# Altium footprint library 排针排座.PcbLib: 344 footprints (part 17 of 22)
Each footprint in its own frame and in the unit in brackets; x right, y up, seen from the top. Pads: shape width x height; smd on the part's side, far side on the other; paste and mask are expansions set on the pad; w line width, h text height; cw(c..) or ccw(c..) is an arc to the next point about the centre after c.
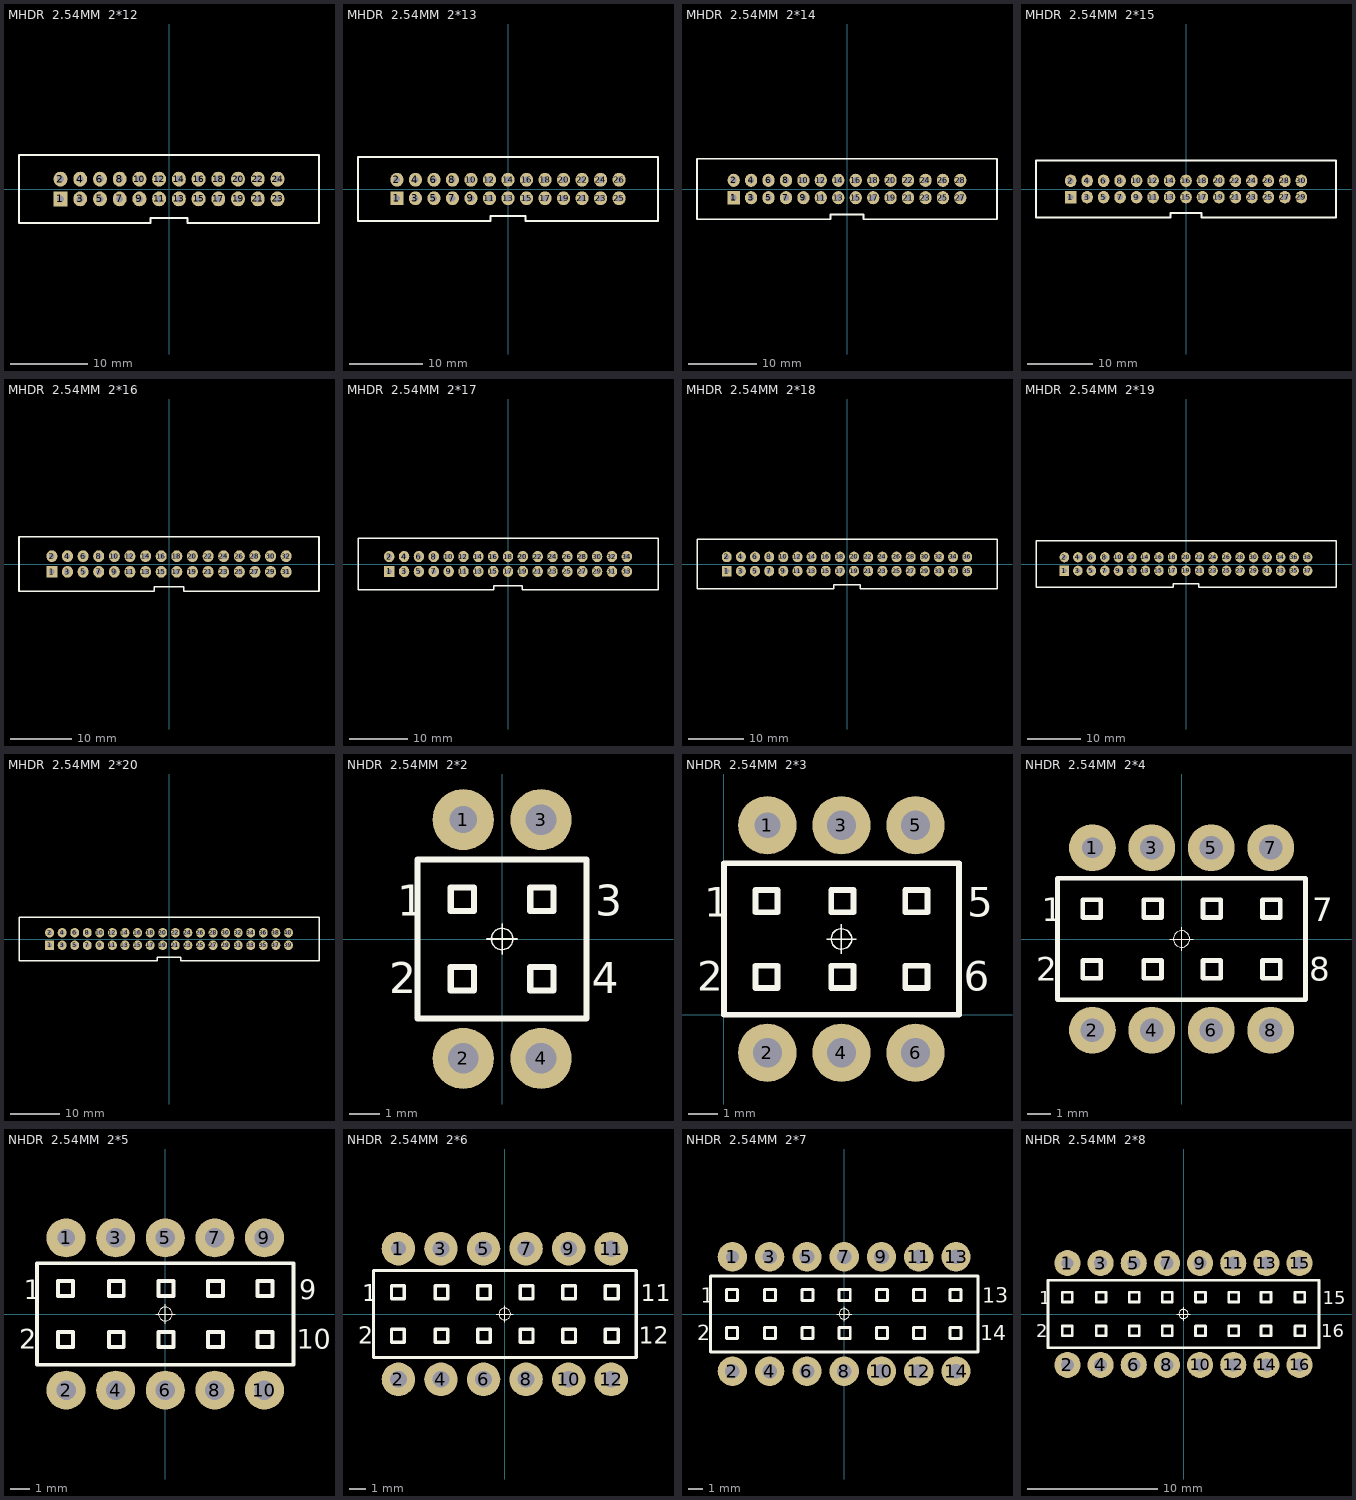
[diagram p16: the footprints below, top view; thin cyan lines are the x and y axes]

## MHDR  2.54MM  2*12 [mm] "24P"
height 8.8
pads (24):
  rect 1.778x1.905 hole 0.9: 1(-13.97,-1.27)
  oval 1.778x1.905 hole 0.9: 2(-13.97,1.27) 3(-11.43,-1.27) 4(-11.43,1.27) 5(-8.89,-1.27) 6(-8.89,1.27) 7(-6.35,-1.27) 8(-6.35,1.27) 9(-3.81,-1.27) 10(-3.81,1.27) 11(-1.27,-1.27) 12(-1.27,1.27) 13(1.27,-1.27) 14(1.27,1.27) 15(3.81,-1.27) 16(3.81,1.27) 17(6.35,-1.27) 18(6.35,1.27) 19(8.89,-1.27) 20(8.89,1.27) 21(11.43,-1.27) 22(11.43,1.27) 23(13.97,-1.27) 24(13.97,1.27)
Top Overlay:
  lines w0.254: -19.31,-4.4 -19.31,4.4 19.31,4.4 19.31,-4.4 2.4,-4.4 2.4,-3.708 -2.4,-3.708 -2.4,-4.4 -19.31,-4.4
3D body "MHDR2.54_24P.step": height 8.8, standoff -3.2, extent -19.31,-4.4 19.31,4.4

## MHDR  2.54MM  2*13 [mm] "26P"
height 8.8
pads (26):
  rect 1.778x1.905 hole 0.9: 1(-15.24,-1.27)
  oval 1.778x1.905 hole 0.9: 2(-15.24,1.27) 3(-12.7,-1.27) 4(-12.7,1.27) 5(-10.16,-1.27) 6(-10.16,1.27) 7(-7.62,-1.27) 8(-7.62,1.27) 9(-5.08,-1.27) 10(-5.08,1.27) 11(-2.54,-1.27) 12(-2.54,1.27) 13(0,-1.27) 14(0,1.27) 15(2.54,-1.27) 16(2.54,1.27) 17(5.08,-1.27) 18(5.08,1.27) 19(7.62,-1.27) 20(7.62,1.27) 21(10.16,-1.27) 22(10.16,1.27) 23(12.7,-1.27) 24(12.7,1.27) 25(15.24,-1.27) 26(15.24,1.27)
Top Overlay:
  lines w0.254: -20.58,-4.4 -20.58,4.4 20.58,4.4 20.58,-4.4 2.4,-4.4 2.4,-3.708 -2.4,-3.708 -2.4,-4.4 -20.58,-4.4
3D body "MHDR2.54_26P.step": height 8.8, standoff -3.2, extent -20.58,-4.4 20.58,4.4

## MHDR  2.54MM  2*14 [mm] "28P"
height 8.8
pads (28):
  rect 1.778x1.905 hole 0.9: 1(-16.51,-1.27)
  oval 1.778x1.905 hole 0.9: 2(-16.51,1.27) 3(-13.97,-1.27) 4(-13.97,1.27) 5(-11.43,-1.27) 6(-11.43,1.27) 7(-8.89,-1.27) 8(-8.89,1.27) 9(-6.35,-1.27) 10(-6.35,1.27) 11(-3.81,-1.27) 12(-3.81,1.27) 13(-1.27,-1.27) 14(-1.27,1.27) 15(1.27,-1.27) 16(1.27,1.27) 17(3.81,-1.27) 18(3.81,1.27) 19(6.35,-1.27) 20(6.35,1.27) 21(8.89,-1.27) 22(8.89,1.27) 23(11.43,-1.27) 24(11.43,1.27) 25(13.97,-1.27) 26(13.97,1.27) 27(16.51,-1.27) 28(16.51,1.27)
Top Overlay:
  lines w0.254: -21.85,-4.4 -2.4,-4.4 -2.4,-3.708 2.4,-3.708 2.4,-4.4 21.85,-4.4 21.85,4.4 -21.85,4.4 -21.85,-4.4
3D body "MHDR2.54_28P.step": height 8.8, standoff -3.2, extent -21.85,-4.4 21.85,4.4

## MHDR  2.54MM  2*15 [mm] "30P"
height 8.8
pads (30):
  rect 1.778x1.905 hole 0.9: 1(-17.78,-1.27)
  oval 1.778x1.905 hole 0.9: 2(-17.78,1.27) 3(-15.24,-1.27) 4(-15.24,1.27) 5(-12.7,-1.27) 6(-12.7,1.27) 7(-10.16,-1.27) 8(-10.16,1.27) 9(-7.62,-1.27) 10(-7.62,1.27) 11(-5.08,-1.27) 12(-5.08,1.27) 13(-2.54,-1.27) 14(-2.54,1.27) 15(0,-1.27) 16(0,1.27) 17(2.54,-1.27) 18(2.54,1.27) 19(5.08,-1.27) 20(5.08,1.27) 21(7.62,-1.27) 22(7.62,1.27) 23(10.16,-1.27) 24(10.16,1.27) 25(12.7,-1.27) 26(12.7,1.27) 27(15.24,-1.27) 28(15.24,1.27) 29(17.78,-1.27) 30(17.78,1.27)
Top Overlay:
  lines w0.254: -23.12,-4.4 -23.12,4.4 23.12,4.4 23.12,-4.4 2.4,-4.4 2.4,-3.708 -2.4,-3.708 -2.4,-4.4 -23.12,-4.4
3D body "MHDR2.54_30P.step": height 8.8, standoff -3.2, extent -23.12,-4.4 23.12,4.4

## MHDR  2.54MM  2*16 [mm] "32P"
height 8.8
pads (32):
  rect 1.778x1.905 hole 0.9: 1(-19.05,-1.27)
  oval 1.778x1.905 hole 0.9: 2(-19.05,1.27) 3(-16.51,-1.27) 4(-16.51,1.27) 5(-13.97,-1.27) 6(-13.97,1.27) 7(-11.43,-1.27) 8(-11.43,1.27) 9(-8.89,-1.27) 10(-8.89,1.27) 11(-6.35,-1.27) 12(-6.35,1.27) 13(-3.81,-1.27) 14(-3.81,1.27) 15(-1.27,-1.27) 16(-1.27,1.27) 17(1.27,-1.27) 18(1.27,1.27) 19(3.81,-1.27) 20(3.81,1.27) 21(6.35,-1.27) 22(6.35,1.27) 23(8.89,-1.27) 24(8.89,1.27) 25(11.43,-1.27) 26(11.43,1.27) 27(13.97,-1.27) 28(13.97,1.27) 29(16.51,-1.27) 30(16.51,1.27) 31(19.05,-1.27) 32(19.05,1.27)
Top Overlay:
  lines w0.254: -24.39,-4.4 -24.39,4.4 24.39,4.4 24.39,-4.4 2.4,-4.4 2.4,-3.708 -2.4,-3.708 -2.4,-4.4 -24.39,-4.4
3D body "MHDR2.54_32P.step": height 8.8, standoff -3.2, extent -24.39,-4.4 24.39,4.4

## MHDR  2.54MM  2*17 [mm] "34P"
height 8.8
pads (34):
  rect 1.778x1.905 hole 0.9: 1(-20.32,-1.27)
  oval 1.778x1.905 hole 0.9: 2(-20.32,1.27) 3(-17.78,-1.27) 4(-17.78,1.27) 5(-15.24,-1.27) 6(-15.24,1.27) 7(-12.7,-1.27) 8(-12.7,1.27) 9(-10.16,-1.27) 10(-10.16,1.27) 11(-7.62,-1.27) 12(-7.62,1.27) 13(-5.08,-1.27) 14(-5.08,1.27) 15(-2.54,-1.27) 16(-2.54,1.27) 17(0,-1.27) 18(0,1.27) 19(2.54,-1.27) 20(2.54,1.27) 21(5.08,-1.27) 22(5.08,1.27) 23(7.62,-1.27) 24(7.62,1.27) 25(10.16,-1.27) 26(10.16,1.27) 27(12.7,-1.27) 28(12.7,1.27) 29(15.24,-1.27) 30(15.24,1.27) 31(17.78,-1.27) 32(17.78,1.27) 33(20.32,-1.27) 34(20.32,1.27)
Top Overlay:
  lines w0.254: -25.66,-4.4 -25.66,4.4 25.66,4.4 25.66,-4.4 2.4,-4.4 2.4,-3.708 -2.4,-3.708 -2.4,-4.4 -25.66,-4.4
3D body "MHDR2.54_34P.step": height 8.8, standoff -3.2, extent -25.66,-4.4 25.66,4.4

## MHDR  2.54MM  2*18 [mm] "36P"
height 8.8
pads (36):
  rect 1.778x1.905 hole 0.9: 1(-21.59,-1.27)
  oval 1.778x1.905 hole 0.9: 2(-21.59,1.27) 3(-19.05,-1.27) 4(-19.05,1.27) 5(-16.51,-1.27) 6(-16.51,1.27) 7(-13.97,-1.27) 8(-13.97,1.27) 9(-11.43,-1.27) 10(-11.43,1.27) 11(-8.89,-1.27) 12(-8.89,1.27) 13(-6.35,-1.27) 14(-6.35,1.27) 15(-3.81,-1.27) 16(-3.81,1.27) 17(-1.27,-1.27) 18(-1.27,1.27) 19(1.27,-1.27) 20(1.27,1.27) 21(3.81,-1.27) 22(3.81,1.27) 23(6.35,-1.27) 24(6.35,1.27) 25(8.89,-1.27) 26(8.89,1.27) 27(11.43,-1.27) 28(11.43,1.27) 29(13.97,-1.27) 30(13.97,1.27) 31(16.51,-1.27) 32(16.51,1.27) 33(19.05,-1.27) 34(19.05,1.27) 35(21.59,-1.27) 36(21.59,1.27)
Top Overlay:
  lines w0.254: -26.93,-4.4 -2.4,-4.4 -2.4,-3.708 2.4,-3.708 2.4,-4.4 26.93,-4.4 26.93,4.4 -26.93,4.4 -26.93,-4.4
3D body "MHDR2.54_36P.step": height 8.8, standoff -3.2, extent -26.93,-4.4 26.93,4.4

## MHDR  2.54MM  2*19 [mm] "38P"
height 8.8
pads (38):
  rect 1.778x1.905 hole 0.9: 1(-22.86,-1.27)
  oval 1.778x1.905 hole 0.9: 2(-22.86,1.27) 3(-20.32,-1.27) 4(-20.32,1.27) 5(-17.78,-1.27) 6(-17.78,1.27) 7(-15.24,-1.27) 8(-15.24,1.27) 9(-12.7,-1.27) 10(-12.7,1.27) 11(-10.16,-1.27) 12(-10.16,1.27) 13(-7.62,-1.27) 14(-7.62,1.27) 15(-5.08,-1.27) 16(-5.08,1.27) 17(-2.54,-1.27) 18(-2.54,1.27) 19(0,-1.27) 20(0,1.27) 21(2.54,-1.27) 22(2.54,1.27) 23(5.08,-1.27) 24(5.08,1.27) 25(7.62,-1.27) 26(7.62,1.27) 27(10.16,-1.27) 28(10.16,1.27) 29(12.7,-1.27) 30(12.7,1.27) 31(15.24,-1.27) 32(15.24,1.27) 33(17.78,-1.27) 34(17.78,1.27) 35(20.32,-1.27) 36(20.32,1.27) 37(22.86,-1.27) 38(22.86,1.27)
Top Overlay:
  lines w0.254: -28.2,-4.4 -2.4,-4.4 -2.4,-3.708 2.4,-3.708 2.4,-4.4 28.2,-4.4 28.2,4.4 -28.2,4.4 -28.2,-4.4
3D body "MHDR2.54_38P.step": height 8.8, standoff -3.2, extent -28.2,-4.4 28.2,4.4

## MHDR  2.54MM  2*20 [mm] "40P"
height 8.8
pads (40):
  rect 1.778x1.905 hole 0.9: 1(-24.13,-1.27)
  oval 1.778x1.905 hole 0.9: 2(-24.13,1.27) 3(-21.59,-1.27) 4(-21.59,1.27) 5(-19.05,-1.27) 6(-19.05,1.27) 7(-16.51,-1.27) 8(-16.51,1.27) 9(-13.97,-1.27) 10(-13.97,1.27) 11(-11.43,-1.27) 12(-11.43,1.27) 13(-8.89,-1.27) 14(-8.89,1.27) 15(-6.35,-1.27) 16(-6.35,1.27) 17(-3.81,-1.27) 18(-3.81,1.27) 19(-1.27,-1.27) 20(-1.27,1.27) 21(1.27,-1.27) 22(1.27,1.27) 23(3.81,-1.27) 24(3.81,1.27) 25(6.35,-1.27) 26(6.35,1.27) 27(8.89,-1.27) 28(8.89,1.27) 29(11.43,-1.27) 30(11.43,1.27) 31(13.97,-1.27) 32(13.97,1.27) 33(16.51,-1.27) 34(16.51,1.27) 35(19.05,-1.27) 36(19.05,1.27) 37(21.59,-1.27) 38(21.59,1.27) 39(24.13,-1.27) 40(24.13,1.27)
Top Overlay:
  lines w0.254: -30.3,-4.4 -2.4,-4.4 -2.4,-3.708 2.4,-3.708 2.4,-4.4 30.3,-4.4 30.3,4.4 -30.3,4.4 -30.3,-4.4
3D body "MHDR2.54_40P.step": height 8.8, standoff -3.2, extent -29.47,-4.4 29.47,4.4

## NHDR  2.54MM  2*2 [mm] "脚距：2.54mm，直插双排母"
height 5
pads (4):
  round 2 hole 0.889: 1(-1.27,3.9)
  round 2 hole 1: 2(-1.27,-3.9) 3(1.27,3.9) 4(1.27,-3.9)
Top Overlay:
  circle w0.05: c0,0 r0.35
  lines w0.05: -0.5,0 0.5,0 ; 0,-0.5 0,0.5
  lines w0.2: -2.76,-2.6 -2.76,2.6 2.76,2.6 2.76,-2.6 -2.76,-2.6 ; -1.681,-1.681 -1.681,-0.919 -0.919,-0.919 -0.919,-1.681 -1.681,-1.681 ; -1.681,0.919 -1.681,1.681 -0.919,1.681 -0.919,0.919 -1.681,0.919 ; 0.919,-1.681 0.919,-0.919 1.681,-0.919 1.681,-1.681 0.919,-1.681 ; 0.919,0.919 0.919,1.681 1.681,1.681 1.681,0.919 0.919,0.919
  text "1" at -3.429,0.762 h1.02
  text "2" at -3.683,-1.778 h1.02
  text "4" at 2.921,-1.778 h1.02
  text "3" at 3.048,0.762 h1.02
3D body "NHDR  2.54MM  2-2.step": height 5.3, standoff -3.1, extent -2.76,-3.9 2.76,3.9

## NHDR  2.54MM  2*3 [mm] "脚距：2.54mm，直插双排母"
height 5
pads (6):
  round 2 hole 0.889: 1(1.49,6.5)
  round 2 hole 1: 2(1.49,-1.3) 3(4.03,6.5) 4(4.03,-1.3) 5(6.57,6.5) 6(6.57,-1.3)
Top Overlay:
  circle w0.05: c4.03,2.6 r0.35
  lines w0.05: 3.53,2.6 4.53,2.6 ; 4.03,2.1 4.03,3.1
  lines w0.2: 0,0 8.06,0 8.06,5.2 0,5.2 0,0 ; 1.079,0.919 1.079,1.681 1.841,1.681 1.841,0.919 1.079,0.919 ; 1.079,3.519 1.079,4.281 1.841,4.281 1.841,3.519 1.079,3.519 ; 3.679,0.919 3.679,1.681 4.441,1.681 4.441,0.919 3.679,0.919 ; 3.679,3.519 3.679,4.281 4.441,4.281 4.441,3.519 3.679,3.519 ; 6.219,0.919 6.981,0.919 6.981,1.681 6.219,1.681 6.219,0.919 ; 6.219,3.519 6.981,3.519 6.981,4.281 6.219,4.281 6.219,3.519
  text "5" at 8.348,3.362 h1.02
  text "6" at 8.221,0.822 h1.02
  text "1" at -0.669,3.362 h1.02
  text "2" at -0.923,0.822 h1.02
3D body "NHDR  2.54MM  2-3.step": height 5.3, standoff -3.1, extent 0,-1.3 8.06,6.5

## NHDR  2.54MM  2*4 [mm] "脚距：2.54mm，直插双排母"
height 5
pads (8):
  round 2 hole 0.889: 1(-3.81,3.9)
  round 2 hole 1: 2(-3.81,-3.9) 3(-1.27,3.9) 4(-1.27,-3.9) 5(1.27,3.9) 6(1.27,-3.9) 7(3.81,3.9) 8(3.81,-3.9)
Top Overlay:
  circle w0.05: c0,0 r0.35
  lines w0.05: -0.5,0 0.5,0 ; 0,-0.5 0,0.5
  lines w0.2: -5.3,-2.6 -5.3,2.6 5.3,2.6 5.3,-2.6 -5.3,-2.6 ; -4.221,-1.681 -4.221,-0.919 -3.459,-0.919 -3.459,-1.681 -4.221,-1.681 ; -4.221,0.919 -4.221,1.681 -3.459,1.681 -3.459,0.919 -4.221,0.919 ; -1.621,-1.681 -1.621,-0.919 -0.859,-0.919 -0.859,-1.681 -1.621,-1.681 ; -1.621,0.919 -1.621,1.681 -0.859,1.681 -0.859,0.919 -1.621,0.919 ; 0.919,-1.681 1.681,-1.681 1.681,-0.919 0.919,-0.919 0.919,-1.681 ; 0.919,0.919 1.681,0.919 1.681,1.681 0.919,1.681 0.919,0.919 ; 3.459,-1.681 3.459,-0.919 4.221,-0.919 4.221,-1.681 3.459,-1.681 ; 3.459,0.919 3.459,1.681 4.221,1.681 4.221,0.919 3.459,0.919
  text "8" at 5.461,-1.778 h1.02
  text "7" at 5.588,0.762 h1.02
  text "1" at -5.969,0.762 h1.02
  text "2" at -6.223,-1.778 h1.02
3D body "NHDR  2.54MM  2-4.step": height 5.3, standoff -3.1, extent -5.308,-3.891 5.291,3.909

## NHDR  2.54MM  2*5 [mm] "脚距：2.54mm，直插双排母"
height 5
pads (10):
  round 2 hole 0.889: 1(-5.08,3.9)
  round 2 hole 1: 2(-5.08,-3.9) 3(-2.54,3.9) 4(-2.54,-3.9) 5(0,3.9) 6(0,-3.9) 7(2.54,3.9) 8(2.54,-3.9) 9(5.08,3.9) 10(5.08,-3.9)
Top Overlay:
  circle w0.05: c0,0 r0.35
  lines w0.05: -0.5,0 0.5,0 ; 0,-0.5 0,0.5
  lines w0.2: -6.57,-2.6 6.57,-2.6 6.57,2.6 -6.57,2.6 -6.57,-2.6 ; -5.491,-1.681 -4.729,-1.681 -4.729,-0.919 -5.491,-0.919 -5.491,-1.681 ; -5.491,0.919 -4.729,0.919 -4.729,1.681 -5.491,1.681 -5.491,0.919 ; -2.891,-1.681 -2.129,-1.681 -2.129,-0.919 -2.891,-0.919 -2.891,-1.681 ; -2.891,0.919 -2.129,0.919 -2.129,1.681 -2.891,1.681 -2.891,0.919 ; -0.351,-1.681 -0.351,-0.919 0.411,-0.919 0.411,-1.681 -0.351,-1.681 ; -0.351,0.919 -0.351,1.681 0.411,1.681 0.411,0.919 -0.351,0.919 ; 2.189,-1.681 2.951,-1.681 2.951,-0.919 2.189,-0.919 2.189,-1.681 ; 2.189,0.919 2.951,0.919 2.951,1.681 2.189,1.681 2.189,0.919 ; 4.729,-1.681 5.491,-1.681 5.491,-0.919 4.729,-0.919 4.729,-1.681 ; 4.729,0.919 5.491,0.919 5.491,1.681 4.729,1.681 4.729,0.919
  text "2" at -7.493,-1.778 h1.02
  text "1" at -7.239,0.762 h1.02
  text "10" at 6.731,-1.778 h1.02
  text "9" at 6.858,0.762 h1.02
3D body "NHDR  2.54MM  2-5.step": height 5.3, standoff -3.1, extent -6.57,-3.9 6.57,3.9

## NHDR  2.54MM  2*6 [mm] "脚距：2.54mm，直插双排母"
height 5
pads (12):
  round 2 hole 0.889: 1(-6.35,3.9)
  round 2 hole 1: 2(-6.35,-3.9) 3(-3.81,3.9) 4(-3.81,-3.9) 5(-1.27,3.9) 6(-1.27,-3.9) 7(1.27,3.9) 8(1.27,-3.9) 9(3.81,3.9) 10(3.81,-3.9) 11(6.35,3.9) 12(6.35,-3.9)
Top Overlay:
  circle w0.05: c0,0 r0.35
  lines w0.05: -0.5,0 0.5,0 ; 0,-0.5 0,0.5
  lines w0.2: -7.84,-2.6 7.84,-2.6 7.84,2.6 -7.84,2.6 -7.84,-2.6 ; -6.761,-1.681 -5.999,-1.681 -5.999,-0.919 -6.761,-0.919 -6.761,-1.681 ; -6.761,0.919 -5.999,0.919 -5.999,1.681 -6.761,1.681 -6.761,0.919 ; -4.161,-1.681 -3.399,-1.681 -3.399,-0.919 -4.161,-0.919 -4.161,-1.681 ; -4.161,0.919 -3.399,0.919 -3.399,1.681 -4.161,1.681 -4.161,0.919 ; -1.621,-1.681 -1.621,-0.919 -0.859,-0.919 -0.859,-1.681 -1.621,-1.681 ; -1.621,0.919 -1.621,1.681 -0.859,1.681 -0.859,0.919 -1.621,0.919 ; 0.919,-1.681 1.681,-1.681 1.681,-0.919 0.919,-0.919 0.919,-1.681 ; 0.919,0.919 1.681,0.919 1.681,1.681 0.919,1.681 0.919,0.919 ; 3.459,-1.681 4.221,-1.681 4.221,-0.919 3.459,-0.919 3.459,-1.681 ; 3.459,0.919 4.221,0.919 4.221,1.681 3.459,1.681 3.459,0.919 ; 5.999,-1.681 6.761,-1.681 6.761,-0.919 5.999,-0.919 5.999,-1.681 ; 5.999,0.919 6.761,0.919 6.761,1.681 5.999,1.681 5.999,0.919
  text "11" at 8.128,0.762 h1.02
  text "12" at 8.001,-1.778 h1.02
  text "2" at -8.763,-1.778 h1.02
  text "1" at -8.509,0.762 h1.02
3D body "NHDR  2.54MM  2-6.step": height 5.3, standoff -3.1, extent -7.84,-3.9 7.84,3.9

## NHDR  2.54MM  2*7 [mm] "脚距：2.54mm，直插双排母"
height 5
pads (14):
  round 2 hole 0.889: 1(-7.62,3.9)
  round 2 hole 1: 2(-7.62,-3.9) 3(-5.08,3.9) 4(-5.08,-3.9) 5(-2.54,3.9) 6(-2.54,-3.9) 7(0,3.9) 8(0,-3.9) 9(2.54,3.9) 10(2.54,-3.9) 11(5.08,3.9) 12(5.08,-3.9) 13(7.62,3.9) 14(7.62,-3.9)
Top Overlay:
  circle w0.05: c0,0 r0.35
  lines w0.05: -0.5,0 0.5,0 ; 0,-0.5 0,0.5
  lines w0.2: -9.11,-2.6 9.11,-2.6 9.11,2.6 -9.11,2.6 -9.11,-2.6 ; -8.031,-1.681 -7.269,-1.681 -7.269,-0.919 -8.031,-0.919 -8.031,-1.681 ; -8.031,0.919 -7.269,0.919 -7.269,1.681 -8.031,1.681 -8.031,0.919 ; -5.431,-1.681 -4.669,-1.681 -4.669,-0.919 -5.431,-0.919 -5.431,-1.681 ; -5.431,0.919 -4.669,0.919 -4.669,1.681 -5.431,1.681 -5.431,0.919 ; -2.891,-1.681 -2.891,-0.919 -2.129,-0.919 -2.129,-1.681 -2.891,-1.681 ; -2.891,0.919 -2.891,1.681 -2.129,1.681 -2.129,0.919 -2.891,0.919 ; -0.351,-1.681 0.411,-1.681 0.411,-0.919 -0.351,-0.919 -0.351,-1.681 ; -0.351,0.919 0.411,0.919 0.411,1.681 -0.351,1.681 -0.351,0.919 ; 2.189,-1.681 2.951,-1.681 2.951,-0.919 2.189,-0.919 2.189,-1.681 ; 2.189,0.919 2.951,0.919 2.951,1.681 2.189,1.681 2.189,0.919 ; 4.729,-1.681 5.491,-1.681 5.491,-0.919 4.729,-0.919 4.729,-1.681 ; 4.729,0.919 5.491,0.919 5.491,1.681 4.729,1.681 4.729,0.919 ; 7.209,-1.681 7.209,-0.919 7.971,-0.919 7.971,-1.681 7.209,-1.681 ; 7.209,0.919 7.209,1.681 7.971,1.681 7.971,0.919 7.209,0.919
  text "14" at 9.271,-1.778 h1.02
  text "13" at 9.398,0.762 h1.02
  text "2" at -10.033,-1.778 h1.02
  text "1" at -9.779,0.762 h1.02
3D body "NHDR  2.54MM  2-7.step": height 5.3, standoff -3.1, extent -9.11,-3.9 9.11,3.9

## NHDR  2.54MM  2*8 [mm] "脚距：2.54mm，直插双排母"
height 5
pads (16):
  round 2 hole 0.889: 1(-8.89,3.9)
  round 2 hole 1: 2(-8.89,-3.9) 3(-6.35,3.9) 4(-6.35,-3.9) 5(-3.81,3.9) 6(-3.81,-3.9) 7(-1.27,3.9) 8(-1.27,-3.9) 9(1.27,3.9) 10(1.27,-3.9) 11(3.81,3.9) 12(3.81,-3.9) 13(6.35,3.9) 14(6.35,-3.9) 15(8.89,3.9) 16(8.89,-3.9)
Top Overlay:
  circle w0.05: c0,0 r0.35
  lines w0.05: -0.5,0 0.5,0 ; 0,-0.5 0,0.5
  lines w0.2: -10.38,-2.6 -10.38,2.6 10.38,2.6 10.38,-2.6 -10.38,-2.6 ; -9.301,-1.681 -8.539,-1.681 -8.539,-0.919 -9.301,-0.919 -9.301,-1.681 ; -9.301,0.919 -8.539,0.919 -8.539,1.681 -9.301,1.681 -9.301,0.919 ; -6.701,-1.681 -5.939,-1.681 -5.939,-0.919 -6.701,-0.919 -6.701,-1.681 ; -6.701,0.919 -5.939,0.919 -5.939,1.681 -6.701,1.681 -6.701,0.919 ; -4.161,-1.681 -4.161,-0.919 -3.399,-0.919 -3.399,-1.681 -4.161,-1.681 ; -4.161,0.919 -4.161,1.681 -3.399,1.681 -3.399,0.919 -4.161,0.919 ; -1.621,-1.681 -0.859,-1.681 -0.859,-0.919 -1.621,-0.919 -1.621,-1.681 ; -1.621,0.919 -0.859,0.919 -0.859,1.681 -1.621,1.681 -1.621,0.919 ; 0.919,-1.681 1.681,-1.681 1.681,-0.919 0.919,-0.919 0.919,-1.681 ; 0.919,0.919 1.681,0.919 1.681,1.681 0.919,1.681 0.919,0.919 ; 3.459,-1.681 4.221,-1.681 4.221,-0.919 3.459,-0.919 3.459,-1.681 ; 3.459,0.919 4.221,0.919 4.221,1.681 3.459,1.681 3.459,0.919 ; 5.939,-1.681 5.939,-0.919 6.701,-0.919 6.701,-1.681 5.939,-1.681 ; 5.939,0.919 5.939,1.681 6.701,1.681 6.701,0.919 5.939,0.919 ; 8.539,-1.681 8.539,-0.919 9.301,-0.919 9.301,-1.681 8.539,-1.681 ; 8.539,0.919 8.539,1.681 9.301,1.681 9.301,0.919 8.539,0.919
  text "2" at -11.303,-1.778 h1.02
  text "1" at -11.049,0.762 h1.02
  text "15" at 10.668,0.762 h1.02
  text "16" at 10.541,-1.778 h1.02
3D body "NHDR  2.54MM  2-8.step": height 5.3, standoff -3.1, extent -10.38,-3.9 10.38,3.9